# Altium footprint library Global Library.PcbLib: 97 footprints (part 2 of 7)
Each footprint in its own frame and in the unit in brackets; x right, y up, seen from the top. Pads: shape width x height; smd on the part's side, far side on the other; paste and mask are expansions set on the pad; w line width, h text height; cw(c..) or ccw(c..) is an arc to the next point about the centre after c.
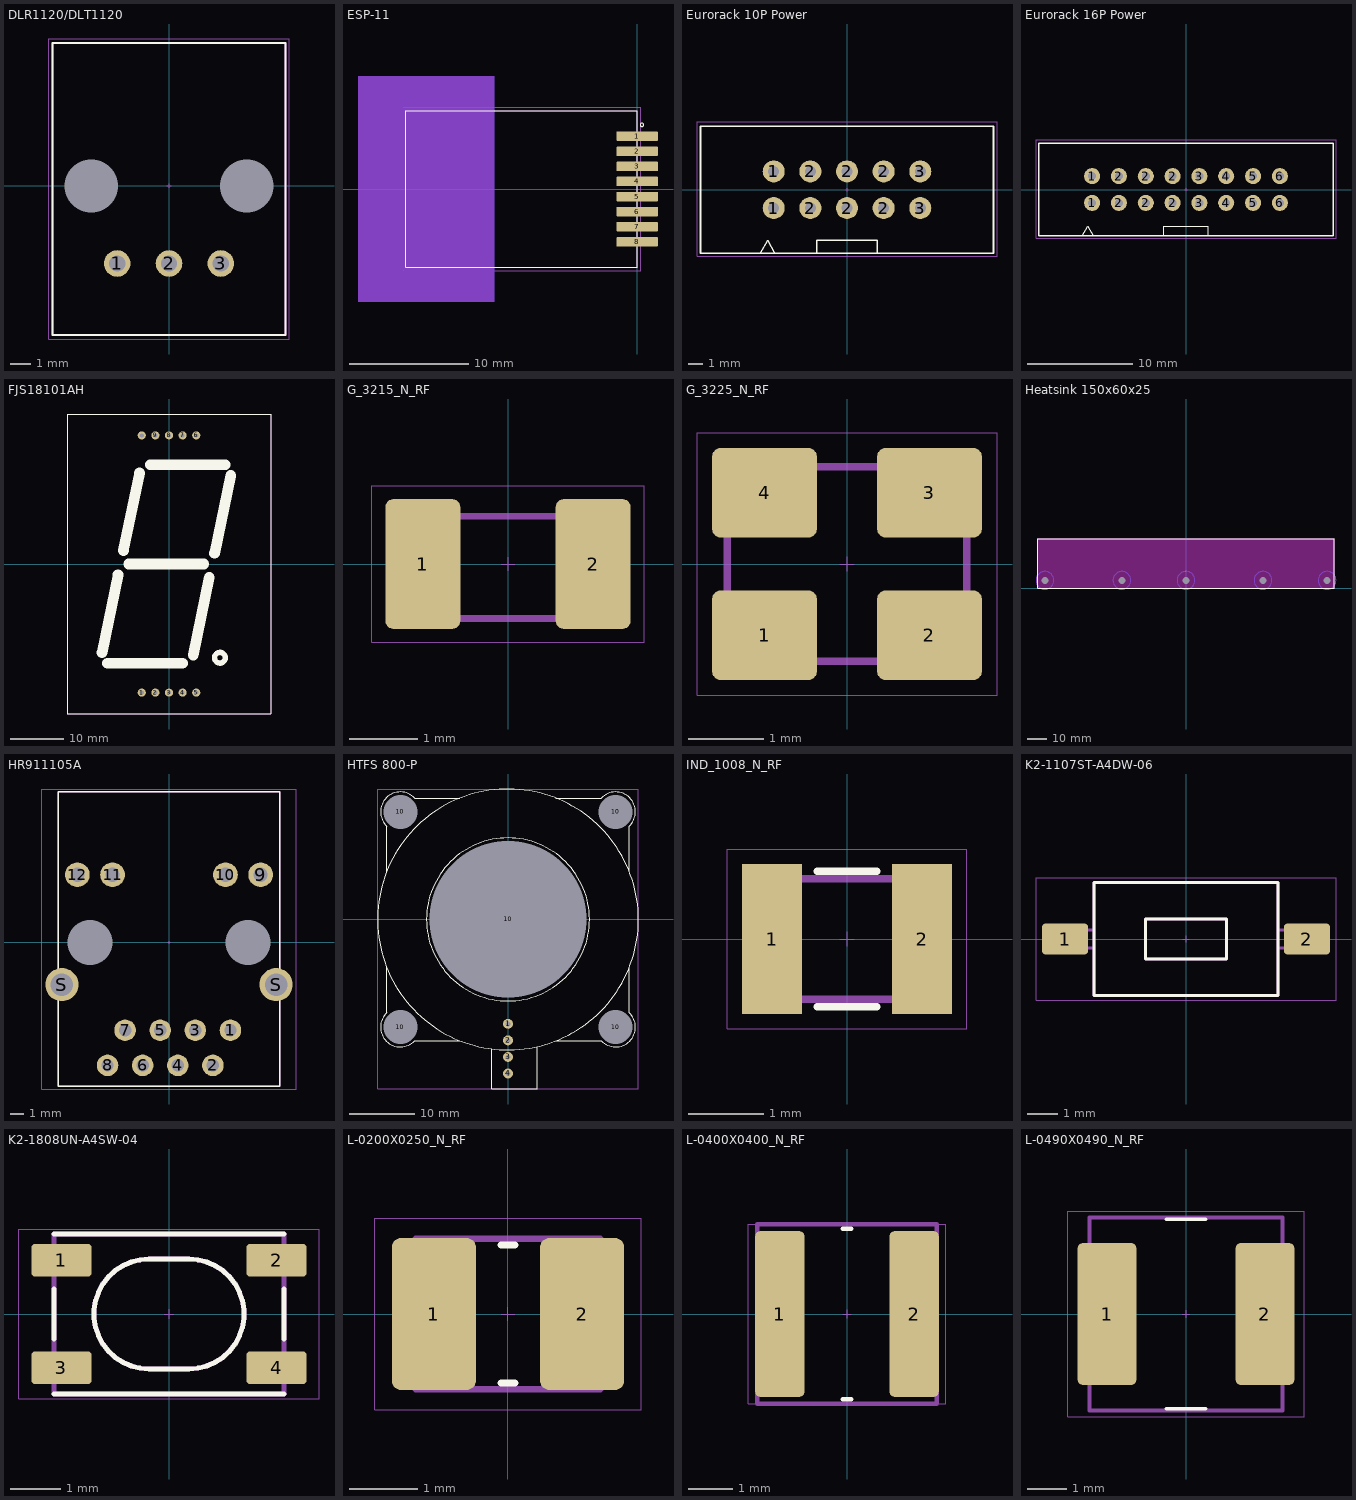
[diagram p1: the footprints below, top view; thin cyan lines are the x and y axes]

## DLR1120/DLT1120 [mm] "Toslink Receiver/Transmitter"
pads (5):
  round 1.3 hole 0.8: 1(-2.54,-3.8) 2(0,-3.8) 3(2.54,-3.8)
  round 0 hole 2.6 unplated: ""(-3.81,0) ""(3.81,0)
Top Overlay:
  lines w0.1: -5.7,-7.3 5.7,-7.3 5.7,7 -5.7,7 -5.7,-7.3
Top Courtyard:
  lines w0.01: -0.1,0 0.1,0 ; 0,-0.1 0,0.1 ; -5.9,-7.5 -5.9,7.2 5.9,7.2 5.9,-7.5 -5.9,-7.5
Top Assembly:
  lines w0.1: -5.7,-7.3 5.7,-7.3 5.7,7 -5.7,7 -5.7,-7.3
Top Assy THT:
  lines w0.1: -5.7,-7.3 5.7,-7.3 5.7,7 -5.7,7 -5.7,-7.3
  text ".Designator" at -6.2,-7.4 h1
3D body "FCR684208R.stp": height 10, standoff -3, extent -4.85,-6.15 4.85,7.35

## ESP-11 [mm]
pads (8):
  rrect20% 3.5x0.8 smd: 1(0,4.445) 2(0,3.175) 3(0,1.905) 4(0,0.635) 5(0,-0.635) 6(0,-1.905) 7(0,-3.175) 8(0,-4.445)
Top Layer keep-out:
  rectangle: -23.5,-9.5 -12,9.5
Bottom Layer keep-out:
  rectangle: -23.5,-9.5 -12,9.5
Top Overlay:
  circle w0.1: c0.4,5.4 r0.141
  lines w0.1: -19.5,-6.6 -19.5,6.6 0,6.6 0,-6.6 -19.5,-6.6
Top Courtyard:
  lines w0.01: -0.1,0 0.1,0 ; 0,-0.1 0,0.1 ; -19.7,-6.9 0.3,-6.9 0.3,6.9 -19.7,6.9 -19.7,-6.9
Top Assembly:
  lines w0.1: -19.5,-6.6 -19.5,6.6 0,6.6 0,-6.6 -19.5,-6.6
Top Assy SMT:
  lines w0.1: -19.5,-6.6 0,-6.6 0,6.6 -19.5,6.6 -19.5,-6.6

## Eurorack 10P Power [mil]
pads (10):
  round 60 hole 30: 1(-200,-50) 1(-200,50) 2(-100,-50) 2(-100,50) 2(0,-50) 2(0,50) 2(100,-50) 2(100,50) 3(200,-50) 3(200,50)
Top Overlay:
  lines w3.94: -236.22,-173.23 -216.54,-137.8 -196.85,-173.23 ; -82.3,-173.23 -82.3,-137.8 0,-137.8 82.3,-137.8 82.3,-173.23
  lines w5: -399.61,-173.23 -399.61,173.23 399.61,173.23 399.61,-173.23 -399.61,-173.23
Top Courtyard:
  lines w0.39: -3.94,0 3.94,0 ; 0,-3.94 0,3.94 ; -409.45,-181.1 -409.45,185.04 409.45,185.04 409.45,-181.1 -409.45,-181.1
Top Assy THT:
  text ".Designator" at -397.64,204.72 h39.37
3D body "User Library-DS1013-10S (IDC-10MS CONNFLY).step": height 354.33, standoff -141.73, extent -403.54,-177.17 403.54,173.23

## Eurorack 16P Power [mil]
pads (16):
  round 60 hole 30: 1(-350,-50) 1(-350,50) 2(-250,-50) 2(-250,50) 2(-150,-50) 2(-150,50) 2(-50,-50) 2(-50,50) 3(50,-50) 3(50,50) 4(150,-50) 4(150,50) 5(250,-50) 5(250,50) 6(350,-50) 6(350,50)
Top Overlay:
  lines w3.94: -386.22,-173.23 -366.54,-137.8 -346.85,-173.23 ; -82.3,-173.23 -82.3,-137.8 0,-137.8 82.3,-137.8 82.3,-173.23
  lines w5: -549.61,-173.23 -549.61,173.23 549.61,173.23 549.61,-173.23 -549.61,-173.23
Top Courtyard:
  lines w0.39: -3.94,0 3.94,0 ; 0,-3.94 0,3.94 ; -559.45,-181.1 -559.45,185.04 559.45,185.04 559.45,-181.1 -559.45,-181.1
Top Assy THT:
  text ".Designator" at -397.64,204.72 h39.37
3D body "30316-6002.stp": height 350, standoff -125, extent -549.21,-166.96 549.79,179.93

## FJS18101AH [mil]
pads (10):
  round 60 hole 30: 1(-200,-944.88) 2(-100,-944.88) 3(0,-944.88) 4(100,-944.88) 5(200,-944.88) 6(200,944.88) 7(100,944.88) 8(0,944.88) 9(-100,944.88) 10(-200,944.88)
Top Overlay:
  circle w39.37: c374.02,-688.98 r39.37
  lines w3.94: -748.03,-1102.36 -748.03,1102.36 748.03,1102.36 748.03,-1102.36 -748.03,-1102.36
  lines w78.74: -492.13,-649.61 -374.02,-78.74 ; -452.76,-728.35 98.43,-728.35 ; -334.65,98.43 -216.54,669.29 ; -295.28,0 255.91,0 ; -137.8,728.35 413.39,728.35 ; 177.17,-669.29 295.28,-98.43 ; 334.65,78.74 452.76,649.61
Top Courtyard:
  lines w0.39: -3.94,0 3.94,0 ; 0,-3.94 0,3.94 ; -748.03,-1102.36 -748.03,1102.36 748.03,1102.36 748.03,-1102.36 -748.03,-1102.36
Top Assembly:
  lines w3.94: -748.03,-1102.36 748.03,-1102.36 748.03,1102.36 -748.03,1102.36 -748.03,-1102.36
Top Assy SMT:
  lines w3.94: -748.03,-1102.36 748.03,-1102.36 748.03,1102.36 -748.03,1102.36 -748.03,-1102.36
Top Assy THT:
  text ".Designator" at -607.97,1018.85 h78.74

## G_3215_N_RF [mm] "Quarz Oscillator 2pin 3.2mm x 1.5mm"
height 0.8
pads (2):
  rrect20% 1.1x1.9 smd: 1(-1.25,0) 2(1.25,0)
Top Courtyard:
  lines w0.01: -0.1,0 0.1,0 ; 0,-0.1 0,0.1 ; -2,-1.15 -2,1.15 2,1.15 2,-1.15 -2,-1.15
Top Assembly:
  lines w0.1: -1.6,-0.8 1.6,-0.8 1.6,0.7 -1.6,0.7 -1.6,-0.8
Top Assy SMT:
  lines w0.1: -1.6,-0.8 1.6,-0.8 1.6,0.7 -1.6,0.7 -1.6,-0.8
  text ".Designator" at -2,1.3 h1
3D body "User Library-IL3X.step": height 0.9, standoff -0.01, extent -1.583,-0.757 1.617,0.743

## G_3225_N_RF [mm] "Crystal Oscillator  2.5mm X 3.2mm"
height 0.7
pads (4):
  rrect20% 1.4x1.2 smd: 1(-1.1,-0.95) 2(1.1,-0.95) 3(1.1,0.95) 4(-1.1,0.95)
Top Courtyard:
  lines w0.01: -0.1,0 0.1,0 ; 0,-0.1 0,0.1 ; -2,-1.75 -2,1.75 2,1.75 2,-1.75 -2,-1.75
Top Assembly:
  lines w0.1: -1.6,-1.3 1.6,-1.3 1.6,1.3 -1.6,1.3 -1.6,-1.3
Top Assy SMT:
  lines w0.1: -1.6,-1.3 1.6,-1.3 1.6,1.3 -1.6,1.3 -1.6,-1.3
  text ".Designator" at -1.7,1.8 h1
3D body "NX3225SA v2.step": height 0.55, standoff 0, extent -1.6,-1.25 1.6,1.25

## Heatsink 150x60x25 [mm]
pads (5):
  round 0 hole 3.5 unplated: 1(-71.261,4) 1(-32.391,4) 1(0,4) 1(38.87,4) 1(71.261,4)
Top Layer keep-out:
  region: -75,25 -75,0 75,0 75,25
Bottom Layer keep-out:
  circle w0.1: c71.261,4 r4.5
  circle w0.1: c38.87,4 r4.5
  circle w0.1: c-71.261,4 r4.5
  circle w0.1: c-32.391,4 r4.5
  circle w0.1: c0,4 r4.5
Top Overlay:
  lines w0.1: -75,0 75,0 75,25 -75,25 -75,0
Top Assembly:
  lines w0.1: -75,0 -75,25 75,25 75,0 -75,0
3D body "Kühlkörper.stp": height 60, standoff 0, extent -75,0 75,25

## HR911105A [mm] "Connector Ethernet 10/100Base-T"
pads (16):
  round 1.558 hole 0.89: 1(4.445,-6.35) 2(3.175,-8.89) 3(1.905,-6.35) 4(0.635,-8.89) 5(-0.635,-6.35) 6(-1.905,-8.89) 7(-3.175,-6.35) 8(-4.445,-8.89)
  round 1.785 hole 1.02: 9(6.625,4.9) 10(4.085,4.9) 11(-4.085,4.9) 12(-6.625,4.9)
  round 0 hole 3.25 unplated: 13(5.715,0) 14(-5.715,0)
  round 2.4 hole 1.63: S(-7.745,-3.05) S(7.745,-3.05)
Top Overlay:
  lines w0.1: -8,-10.4 8,-10.4 8,10.9 -8,10.9 -8,-10.4
Top Courtyard:
  lines w0.01: -0.1,0 0.1,0 ; 0,-0.1 0,0.1 ; -9.2,-10.6 9.2,-10.6 9.2,11.1 -9.2,11.1 -9.2,-10.6
Top Assy SMT:
  lines w0.1: -8,-10.4 -8,10.9 8,10.9 8,-10.4 -8,-10.4
Top Assy THT:
  text ".Designator" at 3.3,-11.3 h1
3D body "HR911105A--3DModel-STEP-56544.STEP": height 13.5, standoff -3.05, extent -8.02,-10.4 8.02,10.9

## HTFS 800-P [mil] "Current Sensor"
pads (9):
  round 60 hole 30: 1(0,-629.92) 2(0,-729.92) 3(0,-829.92) 4(0,-929.92)
  round 60 hole 204.72 unplated: 10(-649.61,-649.61) 10(-649.61,649.61) 10(649.61,-649.61) 10(649.61,649.61)
  round 60 hole 944.88 unplated: 10(0,0)
Top Overlay:
  circle w3.94: c0,0 r492.13
  circle w3.94: c0,0 r787.4
  lines w3.94: -732.28,-289.42 -732.28,-562.99 ccw(c-649.61,-649.61) -562.99,-732.28 -291.34,-732.28 ; -732.28,289.42 -732.28,562.99 cw(c-649.61,649.61) -562.99,732.28 -291.34,732.28 ; -98.43,-781.23 -98.43,-1023.62 177.17,-1023.62 177.17,-767.21 ; 289.42,732.28 562.99,732.28 cw(c649.61,649.61) 732.28,562.99 732.28,291.34 ; 291.34,-732.28 562.99,-732.28 ccw(c649.61,-649.61) 732.28,-562.99 732.28,-289.42
Top Courtyard:
  lines w0.39: -3.94,0 3.94,0 ; 0,-3.94 0,3.94 ; -787.4,-1023.62 787.4,-1023.62 787.4,787.4 -787.4,787.4 -787.4,-1023.62
3D body "HTFS_XXX-P series_blackbox.stp": height 669.29, standoff -118.11, extent -787.4,-1023.62 787.4,787.4

## IND_1008_N_RF [mm] "Inductor 2.5mmx2mm"
height 1.2
pads (2):
  rect 0.8x2 smd: 1(-1,0) 2(1,0)
Top Overlay:
  lines w0.1: -0.4,-0.9 0.4,-0.9 ; -0.4,0.9 0.4,0.9
Top Courtyard:
  lines w0.01: -0.1,0 0.1,0 ; 0,-0.1 0,0.1 ; -1.6,-1.2 1.6,-1.2 1.6,1.2 -1.6,1.2 -1.6,-1.2
Top Assembly:
  lines w0.1: -1.3,-0.8 -1.3,0.8 1.3,0.8 1.3,-0.8 -1.3,-0.8
Top Assy SMT:
  lines w0.1: -1.3,-0.8 1.3,-0.8 1.3,0.8 -1.3,0.8 -1.3,-0.8
  text ".Designator" at -1.7,1.4 h0.8
3D body "DFE252012P-R47M=P2.STEP": height 1.2, standoff 0, extent -1.25,-1 1.25,1

## K2-1107ST-A4DW-06 [mm]
pads (2):
  rrect20% 1.5x1 smd: 1(-3.95,0) 2(3.95,0)
Top Overlay:
  lines w0.1: -3,-1.85 3,-1.85 3,1.85 -3,1.85 -3,-1.85 ; -1.325,-0.65 1.325,-0.65 1.325,0.65 -1.325,0.65 -1.325,-0.65
Top Courtyard:
  lines w0.01: -0.1,0 0.1,0 ; 0,-0.1 0,0.1 ; -4.9,-2 4.9,-2 4.9,2 -4.9,2 -4.9,-2
Top Assembly:
  lines w0.1: -3,-0.3 -4,-0.3 -4,0.3 -3,0.3 ; 3,-0.3 4,-0.3 4,0.3 3,0.3 ; -3,-1.85 -3,1.85 3,1.85 3,-1.85 -3,-1.85 ; -1.325,-0.65 -1.325,0.65 1.325,0.65 1.325,-0.65 -1.325,-0.65
Top Assy SMT:
  lines w0.1: -3,-0.3 -4,-0.3 -4,0.3 -3,0.3 ; 3,-0.3 4,-0.3 4,0.3 3,0.3 ; -3,-1.85 3,-1.85 3,1.85 -3,1.85 -3,-1.85 ; -1.325,-0.65 1.325,-0.65 1.325,0.65 -1.325,0.65 -1.325,-0.65
  text ".Designator" at -1.793,-0.18 h0.8
3D body "User Library-User Library-Button_SMD_3_6x6_1x2_5.step": height 2.5, standoff -0.02, extent -4.012,-1.85 4.012,1.85

## K2-1808UN-A4SW-04 [mm]
pads (4):
  rrect20% 1.2x0.65 smd: 1(-2.15,1.075) 2(2.15,1.075) 3(-2.15,-1.075) 4(2.15,-1.075)
Top Overlay:
  lines w0.1: -2.3,-1.6 2.3,-1.6 ; -2.3,-0.5 -2.3,0.5 ; -2.3,1.6 2.3,1.6 ; 2.3,-0.5 2.3,0.5 ; -0.4,-1.1 cw(c-0.4,0) -0.4,1.1 0.4,1.1 cw(c0.4,0) 0.4,-1.1 -0.4,-1.1
Top Courtyard:
  lines w0.01: -0.1,0 0.1,0 ; 0,-0.1 0,0.1 ; -3,-1.7 3,-1.7 3,1.7 -3,1.7 -3,-1.7
Top Assembly:
  lines w0.1: -2.3,-1.6 2.3,-1.6 2.3,1.6 -2.3,1.6 -2.3,-1.6 ; -0.4,-1.1 cw(c-0.4,0) -0.4,1.1 0.4,1.1 cw(c0.4,0) 0.4,-1.1 -0.4,-1.1
Top Assy SMT:
  lines w0.1: -2.3,-1.6 2.3,-1.6 2.3,1.6 -2.3,1.6 -2.3,-1.6 ; -0.4,-1.1 cw(c-0.4,0) -0.4,1.1 0.4,1.1 cw(c0.4,0) 0.4,-1.1 -0.4,-1.1
  text ".Designator" at -2.3,1.8 h0.8
3D body "buttonK2-1808UN-A4SW-04.step": height 2.5, standoff 0, extent -2.35,-1.65 2.35,1.65

## L-0200X0250_N_RF [mm] "Chip Inductor, 2-Leads, Body 2.50x2.00mm, IPC Medium Density"
height 1.2
pads (2):
  rrect20% 1.23x2.22 smd: 1(-1.085,0) 2(1.085,0)
Top Overlay:
  lines w0.1: -0.1,-1.01 0.1,-1.01 ; -0.1,1.01 0.1,1.01
Top Courtyard:
  lines w0.01: -0.1,0 0.1,0 ; 0,-0.1 0,0.1 ; -1.95,-1.4 1.95,-1.4 1.95,1.4 -1.95,1.4 -1.95,-1.4
Top Assembly:
  lines w0.1: -1.35,-1.1 1.35,-1.1 1.35,1.1 -1.35,1.1 -1.35,-1.1
Top Assy SMT:
  lines w0.1: -1.35,-1.1 -1.35,1.1 1.35,1.1 1.35,-1.1 -1.35,-1.1
  text ".Designator" at -1.323,1.19 h1.2
3D body "L-0200X0250_N_RF.step": height 1.2, standoff 0, extent -1.35,-1.1 1.35,1.1

## L-0400X0400_N_RF [mm] "Chip Inductor, 2-Leads, Body 4.00x4.00mm, IPC Medium Density"
height 3
pads (2):
  rrect20% 1.1x3.7 smd: 1(-1.5,0) 2(1.5,0)
Top Overlay:
  lines w0.1: -0.1,-1.9 0.1,-1.9 ; -0.1,1.9 0.1,1.9
Top Courtyard:
  lines w0.01: -0.1,0 0.1,0 ; 0,-0.1 0,0.1 ; -2.2,-2 -2.2,2 2.2,2 2.2,-2 -2.2,-2
Top Assembly:
  lines w0.1: -2,-2 -2,2 2,2 2,-2 -2,-2
Top Assy SMT:
  lines w0.1: -2,-2 2,-2 2,2 -2,2 -2,-2
  text ".Designator" at -2,2.3 h1.2

## L-0490X0490_N_RF [mm] "Chip Inductor, 2-Leads, Body 4.90x4.90mm, IPC Medium Density"
height 4
pads (2):
  rrect20% 1.5x3.6 smd: 1(-2,0) 2(2,0)
Top Overlay:
  lines w0.1: -0.5,-2.4 0.5,-2.4 ; -0.5,2.4 0.5,2.4
Top Courtyard:
  lines w0.01: -0.1,0 0.1,0 ; 0,-0.1 0,0.1 ; -3,-2.6 -3,2.6 3,2.6 3,-2.6 -3,-2.6
Top Assembly:
  lines w0.1: -2.45,-2.45 -2.45,2.45 2.45,2.45 2.45,-2.45 -2.45,-2.45
Top Assy SMT:
  lines w0.1: -2.45,-2.45 2.45,-2.45 2.45,2.45 -2.45,2.45 -2.45,-2.45
  text ".Designator" at -2.5,2.8 h1.2